# Altium footprint library AD_Lib.PcbLib: 508 footprints (part 20 of 32)
Each footprint in its own frame and in the unit in brackets; x right, y up, seen from the top. Pads: shape width x height; smd on the part's side, far side on the other; paste and mask are expansions set on the pad; w line width, h text height; cw(c..) or ccw(c..) is an arc to the next point about the centre after c.
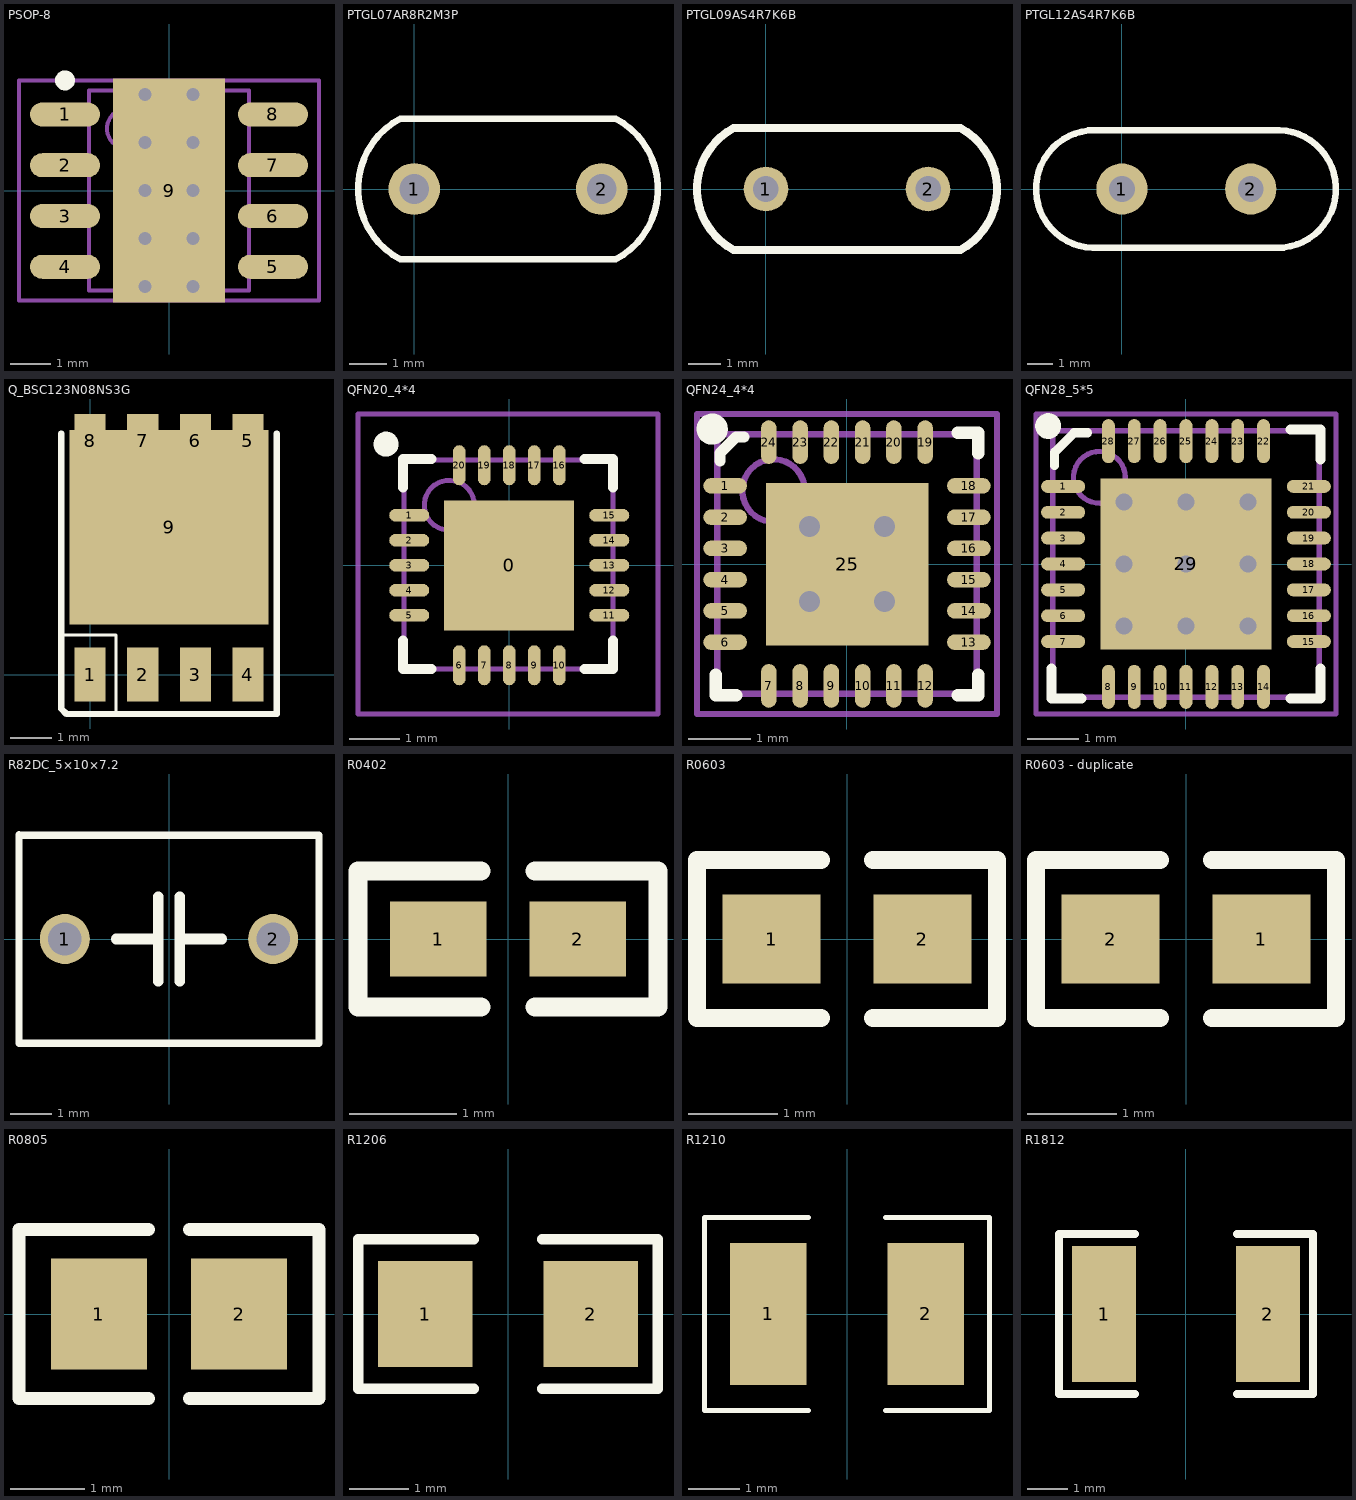
[diagram p19: the footprints below, top view; thin cyan lines are the x and y axes]

## PSOP-8 [mm] "SOP, 8-Leads, Body 5.0x4.0mm (max), Pitch 1.27mm, IPC Medium Density"
height 1.68
pads (9):
  oval 1.75x0.6 smd: 1(-2.6,1.905) 2(-2.6,0.635) 3(-2.6,-0.635) 4(-2.6,-1.905) 5(2.6,-1.905) 6(2.6,-0.635) 7(2.6,0.635) 8(2.6,1.905)
  rect 2.8x5.6 smd: 9(0,0)
via 0.6,-1.2 diameter 0.7 hole 0.33
via -0.6,-1.2 diameter 0.7 hole 0.33
via 0.6,0 diameter 0.7 hole 0.33
via -0.6,0 diameter 0.7 hole 0.33
via 0.6,1.2 diameter 0.7 hole 0.33
via -0.6,1.2 diameter 0.7 hole 0.33
via -0.6,-2.4 diameter 0.7 hole 0.33
via 0.6,-2.4 diameter 0.7 hole 0.33
via -0.6,2.4 diameter 0.7 hole 0.33
via 0.6,2.4 diameter 0.7 hole 0.33
Top Overlay:
  circle w0.25: c-2.6,2.755 r0.125
Mechanical 13:
  circle w0.1: c-1.05,1.55 r0.5
  lines w0.1: -2,-2.5 2,-2.5 2,2.5 -2,2.5 -2,-2.5
Mechanical 15:
  lines w0.1: -0.5,0 0.5,0 ; 0,-0.5 0,0.5 ; -3.75,-2.75 3.75,-2.75 3.75,2.75 -3.75,2.75 -3.75,-2.75
3D body: height 1.68, standoff 0.19, extent -2,-2.5 2,2.5

## PTGL07AR8R2M3P [mm] "Muruta之PTC，PTGL07AR8R2M3P系列"
height 15
pads (2):
  round 1.4 hole 0.8: 1(0,0) 2(5.08,0)
Top Overlay:
  lines w0.178: -0.381,-1.905 cw(c0.635,0) -0.381,1.905 5.461,1.905 cw(c4.445,0) 5.461,-1.905 -0.381,-1.905

## PTGL09AS4R7K6B [mm] "Muruta之PTC，PTGL09AS4R7K6B系列"
height 14.3
pads (2):
  round 1.4 hole 0.8: 1(0,0) 2(5.08,0)
Top Overlay:
  lines w0.254: -1.016,-1.905 cw(c0,0) -1.016,1.905 6.096,1.905 cw(c5.08,0) 6.096,-1.905 -1.016,-1.905

## PTGL12AS4R7K6B [mm] "Muruta之PTC，PTGL12AS4R7K6B系列"
height 16.5
pads (2):
  round 2 hole 1: 1(0,0) 2(5.03,0)
Top Overlay:
  lines w0.254: -1.148,-2.302 cw(c-1.056,-0.002) -1.056,2.3 6.148,2.3 ; -1.148,-2.3 6.056,-2.3 ccw(c6.056,0.002) 6.148,2.302

## Q_BSC123N08NS3G [mil] "PD-TDSON-8, 6.8 * 4.7 mm"
height 39.37
pads (9):
  rect 29.5x51.2 smd: 1(0,0) 2(50,0) 3(100,0) 4(150,0) 5(150,222) 6(100,222) 7(50,222) 8(0,222)
  rect 189x185 smd: 9(75,140)
Top Overlay:
  lines w3: -27.47,37.53 24.53,37.53 24.53,-37.47
  lines w6: -27.47,229.11 -27.47,-32.47 -22.47,-37.47 177.36,-37.47 177.36,229.11
Mechanical 15:
  lines w0.1: 71.45,126.52 73.45,128.51

## QFN20_4*4 [mm] "20-Pin Plastic Quad Flat No-Lead 0.65 mm Pitch, IPC Low Density"
height 1
pads (21):
  rect 2.6x2.6 smd: 0(0,0)
  oval 0.8x0.25 smd: 1(-2,1) 2(-2,0.5) 3(-2,0) 4(-2,-0.5) 5(-2,-1) 11(2,-1) 12(2,-0.5) 13(2,0) 14(2,0.5) 15(2,1)
  oval 0.25x0.8 smd: 6(-1,-2) 7(-0.5,-2) 8(0,-2) 9(0.5,-2) 10(1,-2) 16(1,2) 17(0.5,2) 18(0,2) 19(-0.5,2) 20(-1,2)
Top Overlay:
  circle w0.25: c-2.463,2.422 r0.125
  lines w0.2: -2.125,-1.5 -2.125,-2.075 -1.55,-2.075 ; -2.125,1.55 -2.125,2.125 -1.55,2.125 ; 1.5,-2.075 2.075,-2.075 2.075,-1.5 ; 1.5,2.125 2.075,2.125 2.075,1.55
Mechanical 13:
  circle w0.1: c-1.2,1.2 r0.5
  lines w0.1: -2.125,-2.075 2.075,-2.075 2.075,2.125 ; -2.1,-2.075 -2.1,2.1 2.075,2.1
Mechanical 15:
  lines w0.1: -3.025,-2.975 2.975,-2.975 2.975,3.025 -3.025,3.025 -3.025,-2.975
3D body: height 1, standoff 0, extent -2.1,-2.075 2.075,2.1

## QFN24_4*4 [mm] "24-Pin Plastic Quad Flat No-Lead 0.5 mm Pitch"
height 1
pads (25):
  oval 0.7x0.25 smd: 1(-1.95,1.25) 2(-1.95,0.75) 3(-1.95,0.25) 4(-1.95,-0.25) 5(-1.95,-0.75) 6(-1.95,-1.25) 13(1.95,-1.25) 14(1.95,-0.75) 15(1.95,-0.25) 16(1.95,0.25) 17(1.95,0.75) 18(1.95,1.25)
  oval 0.25x0.7 smd: 7(-1.25,-1.95) 8(-0.75,-1.95) 9(-0.25,-1.95) 10(0.25,-1.95) 11(0.75,-1.95) 12(1.25,-1.95) 19(1.25,1.95) 20(0.75,1.95) 21(0.25,1.95) 22(-0.25,1.95) 23(-0.75,1.95) 24(-1.25,1.95)
  rect 2.6x2.6 smd: 25(0,0)
via -0.6,0.6 diameter 0.7 hole 0.33
via 0.6,0.6 diameter 0.7 hole 0.33
via -0.6,-0.6 diameter 0.7 hole 0.33
via 0.6,-0.6 diameter 0.7 hole 0.33
Top Overlay:
  circle w0.25: c-2.157,2.159 r0.125
  lines w0.178: -2.032,1.651 -2.032,1.778 -1.778,2.032 -1.651,2.032
  lines w0.2: -2.1,-1.775 -2.1,-2.1 -1.775,-2.1 ; 1.775,-2.1 2.1,-2.1 2.1,-1.775 ; 1.775,2.1 2.1,2.1 2.1,1.775
Mechanical 13:
  circle w0.1: c-1.175,1.175 r0.5
  lines w0.1: -2.075,-2.075 -2.075,2.075 2.075,2.075 2.075,-2.075 -2.075,-2.075
Mechanical 15:
  lines w0.1: -0.5,0 0.5,0 ; 0,-0.5 0,0.5 ; -2.4,-2.4 -2.4,2.4 2.4,2.4 2.4,-2.4 -2.4,-2.4
3D body: height 1, standoff 0, extent -2.075,-2.075 2.075,2.075

## QFN28_5*5 [mm] "28-Pin Plastic Quad Flat No-Lead 0.5 mm Pitch"
height 1
pads (29):
  oval 0.85x0.25 smd: 1(-2.375,1.5) 2(-2.375,1) 3(-2.375,0.5) 4(-2.375,0) 5(-2.375,-0.5) 6(-2.375,-1) 7(-2.375,-1.5) 15(2.375,-1.5) 16(2.375,-1) 17(2.375,-0.5) 18(2.375,0) 19(2.375,0.5) 20(2.375,1) 21(2.375,1.5)
  oval 0.25x0.85 smd: 8(-1.5,-2.375) 9(-1,-2.375) 10(-0.5,-2.375) 11(0,-2.375) 12(0.5,-2.375) 13(1,-2.375) 14(1.5,-2.375) 22(1.5,2.375) 23(1,2.375) 24(0.5,2.375) 25(0,2.375) 26(-0.5,2.375) 27(-1,2.375) 28(-1.5,2.375)
  rect 3.3x3.3 smd: 29(0,0)
via -1.2,1.2 diameter 0.7 hole 0.33
via 0,1.2 diameter 0.7 hole 0.33
via 1.2,1.2 diameter 0.7 hole 0.33
via -1.2,0 diameter 0.7 hole 0.33
via 0,0 diameter 0.7 hole 0.33
via 1.2,0 diameter 0.7 hole 0.33
via -1.2,-1.2 diameter 0.7 hole 0.33
via 0,-1.2 diameter 0.7 hole 0.33
via 1.2,-1.2 diameter 0.7 hole 0.33
Top Overlay:
  circle w0.25: c-2.665,2.667 r0.125
  lines w0.178: -2.54,1.905 -2.54,2.159 -2.163,2.536 -1.905,2.536
  lines w0.2: -2.6,-2.025 -2.6,-2.6 -2.025,-2.6 ; 2.025,-2.6 2.6,-2.6 2.6,-2.025 ; 2.025,2.6 2.6,2.6 2.6,2.025
Mechanical 13:
  circle w0.1: c-1.675,1.675 r0.5
  lines w0.1: -2.575,-2.575 -2.575,2.575 2.575,2.575 2.575,-2.575 -2.575,-2.575
Mechanical 15:
  lines w0.1: -0.5,0 0.5,0 ; 0,-0.5 0,0.5 ; -2.9,-2.9 -2.9,2.9 2.9,2.9 2.9,-2.9 -2.9,-2.9
3D body: height 1, standoff 0, extent -2.575,-2.575 2.575,2.575

## R82DC_5×10×7.2 [mm] "KEMET之R82系列电容，引脚间距 = 5mm，尺寸 = w × h × l"
height 10
pads (2):
  round 1.2 hole 0.8: 1(-2.5,0) 2(2.5,0)
Top Overlay:
  lines w0.178: -3.6,2.492 3.6,2.492 3.6,-2.5 -3.6,-2.5 -3.6,2.5
  lines w0.254: -1.27,0 -0.254,0 ; -0.254,-1.016 -0.254,1.016 ; 0.254,-1.016 0.254,1.016 ; 0.254,0 1.27,0

## R0402 [mm] "贴片电阻，功率1/24W"
pads (2):
  rect 0.9x0.7 smd: 1(-0.65,0) 2(0.65,0)
Top Overlay:
  lines w0.178: -0.254,-0.635 -1.397,-0.635 -1.397,0.635 -0.254,0.635 ; 0.254,-0.635 1.397,-0.635 1.397,0.635 0.254,0.635

## R0603 [mm] "贴片电阻，功率1/10W"
height 1.1
pads (2):
  rect 1.1x1 smd: 1(-0.85,0) 2(0.85,0)
Top Overlay:
  lines w0.2: -0.293,-0.889 -1.69,-0.889 -1.69,0.889 -0.293,0.889 ; 0.293,-0.889 1.69,-0.889 1.69,0.889 0.293,0.889

## R0603 - duplicate [mm] "贴片电阻，功率1/10W"
height 1.1
pads (2):
  rect 1.1x1 smd: 1(0.85,0) 2(-0.85,0)
Top Overlay:
  lines w0.2: -0.293,-0.889 -1.69,-0.889 -1.69,0.889 -0.293,0.889 ; 0.293,-0.889 1.69,-0.889 1.69,0.889 0.293,0.889

## R0805 [mm] "贴片电阻，功率1/4W"
pads (2):
  rect 1.3x1.5 smd: 1(-0.95,0) 2(0.95,0)
Top Overlay:
  lines w0.178: -0.279,-1.143 -2.032,-1.143 -2.032,1.143 -0.279,1.143 ; 0.279,-1.143 2.032,-1.143 2.032,1.143 0.279,1.143

## R1206 [mm] "公制3216；英制1206；功率1/4W"
height 0.71
pads (2):
  rect 1.6x1.8 smd: 1(-1.4,0) 2(1.4,0)
Top Overlay:
  lines w0.178: -0.584,-1.27 -2.54,-1.27 -2.54,1.27 -0.584,1.27 ; 0.584,-1.27 2.54,-1.27 2.54,1.27 0.584,1.27

## R1210 [mm] "公制3225；英制1210；功率1/3W"
height 0.71
pads (2):
  rect 1.5x2.8 smd: 1(-1.55,0) 2(1.55,0)
Top Overlay:
  lines w0.1: -0.762,-1.9 -2.8,-1.9 -2.8,1.9 -0.762,1.9 ; 0.762,-1.9 2.8,-1.9 2.8,1.9 0.762,1.9

## R1812 [mm] "公制4832；英制1812；功率1/2W"
height 0.7
pads (2):
  rect 1.6x3.4 smd: 1(-2.05,0) 2(2.05,0)
Top Overlay:
  lines w0.2: -1.27,-2 -3.175,-2 -3.175,2 -1.27,2 ; 1.27,-2 3.175,-2 3.175,2 1.27,2